# Altium footprint library MyPCB_Homework.PcbLib: 62 footprints (part 1 of 4)
Each footprint in its own frame and in the unit in brackets; x right, y up, seen from the top. Pads: shape width x height; smd on the part's side, far side on the other; paste and mask are expansions set on the pad; w line width, h text height; cw(c..) or ccw(c..) is an arc to the next point about the centre after c.
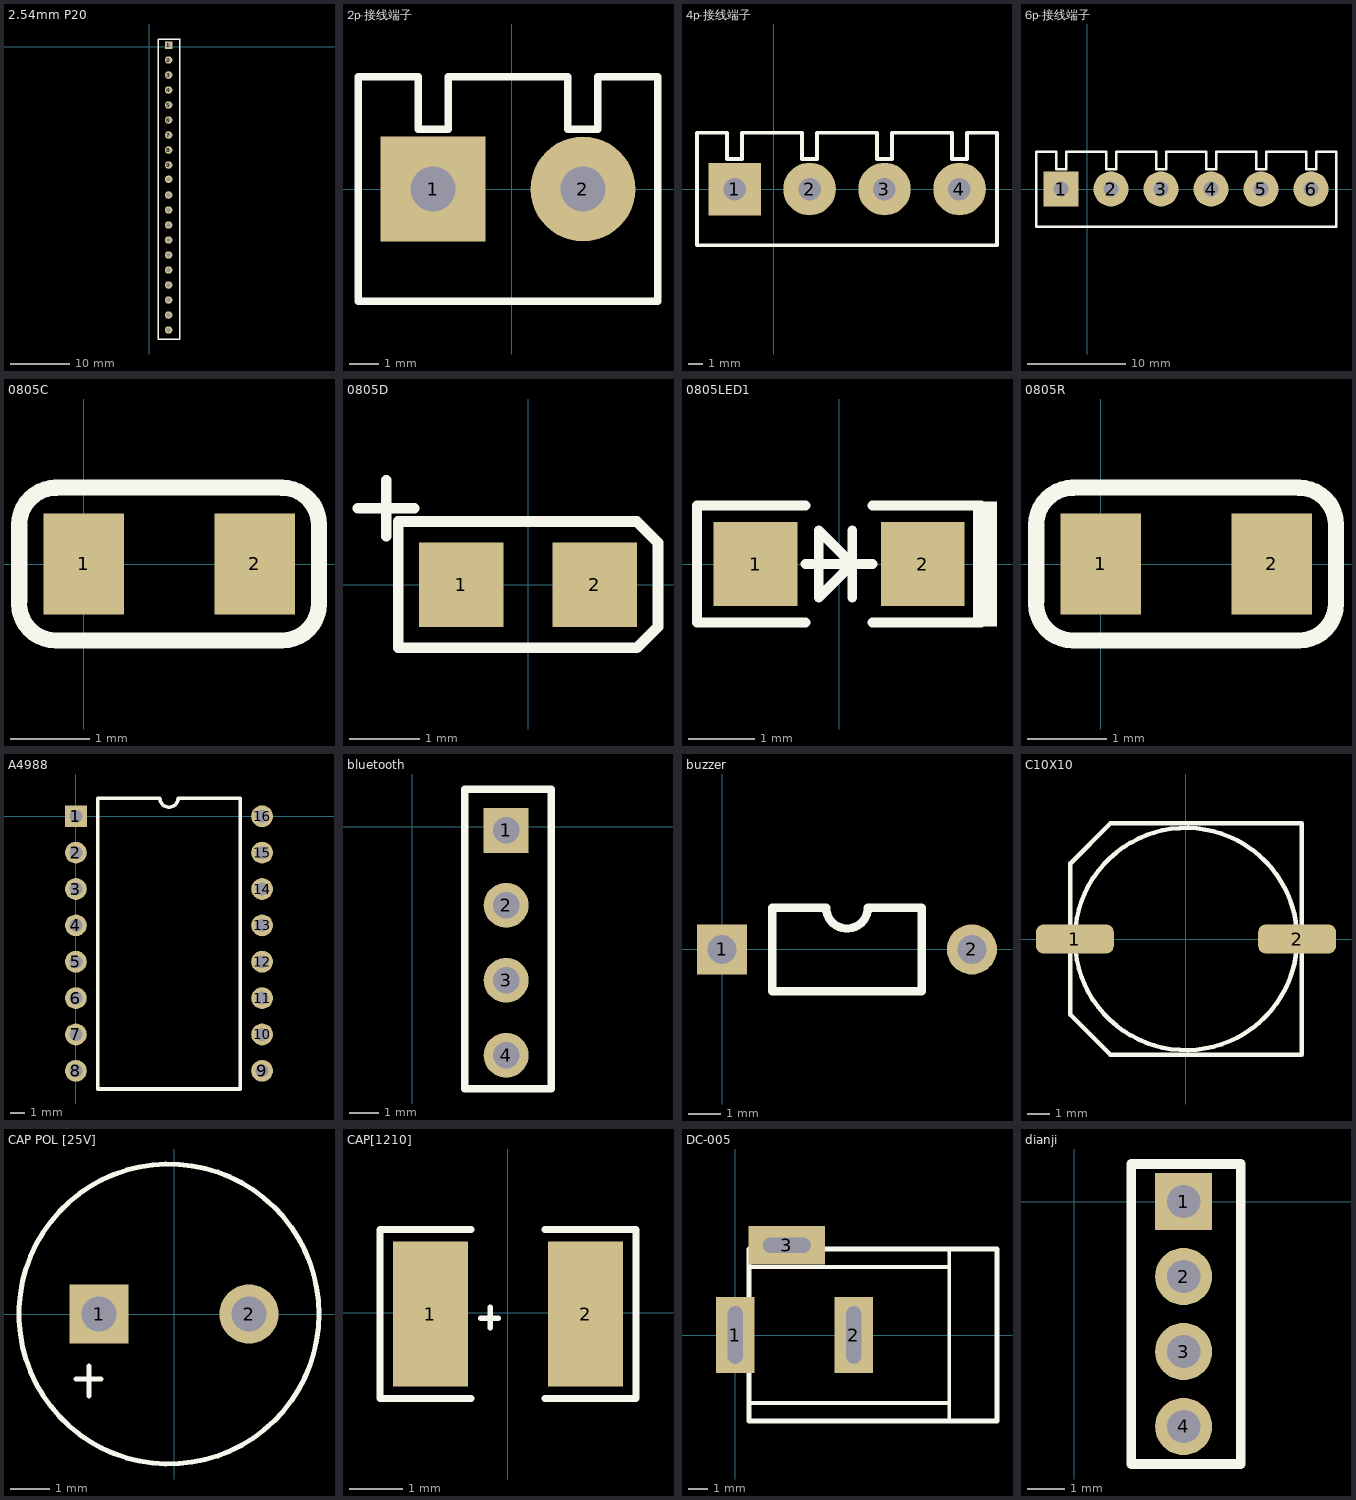
[diagram p0: the footprints below, top view; thin cyan lines are the x and y axes]

## 2.54mm P20 [mil]
pads (20):
  rect 50x50 hole 25: 1(130,10)
  round 50 hole 25: 2(130,-90) 3(130,-190) 4(130,-290) 5(130,-390) 6(130,-490) 7(130,-590) 8(130,-690) 9(130,-790) 10(130,-885) 11(130,-990) 12(130,-1090) 13(130,-1190) 14(130,-1290) 15(130,-1390) 16(130,-1490) 17(130,-1590) 18(130,-1690) 19(130,-1790) 20(130,-1890)
Top Overlay:
  lines w10: 60,-1950 60,50 205,50 205,-1950 60,-1950

## 2p-接线端子 [mil]
pads (2):
  rect 140x140 hole 60: 1(-105,0)
  round 140 hole 60: 2(95,0)
Top Overlay:
  lines w10: -205,-150 -205,150 -125,150 -125,80 -85,80 -85,150 75,150 75,80 115,80 115,150 195,150 195,-150 -205,-150
3D body "User Library-CN_BT_1X2.step": height 393.7, standoff -89.92, extent -201.69,-148.15 211.69,155

## 4p-接线端子 [mil]
pads (4):
  rect 140x140 hole 60: 1(-105,0)
  round 140 hole 60: 2(95,0) 3(295,0) 4(495,0)
Top Overlay:
  lines w10: -5,-150 395,-150 595,-150 ; -5,150 75,150 ; 590,150 595,150 ; 75,80 75,150 ; 75,80 115,80 ; 75,80 75,150 ; 75,80 115,80 ; 75,150 -85,150 -85,80 -125,80 -125,150 -205,150 -205,-150 195,-150 595,-150 ; 115,80 115,150 ; 115,80 115,150 ; 115,150 275,150 ; 115,150 195,150 275,150 ; 275,80 275,150 ; 275,80 315,80 ; 275,80 315,80 ; 275,80 275,150 ; 315,80 315,150 ; 315,80 315,150 ; 315,150 395,150 475,150 ; 315,150 475,150 ; 475,80 475,150 ; 475,80 515,80 ; 475,80 515,80 ; 475,80 475,150 ; 475,80 515,80 ; 475,80 475,150 ; 515,80 515,150 ; 515,80 515,150 ; 515,80 515,150 ; 515,150 595,150 ; 515,150 595,150 ; 595,-150 595,150
3D body "User Library-CN_BT_1X2.step": height 393.7, standoff -89.92, extent 198.31,-148.15 611.69,155
3D body "User Library-CN_BT_1X2.step": height 393.7, standoff -89.92, extent -201.69,-148.15 211.69,155

## 6p-接线端子 [mil]
pads (6):
  rect 140x140 hole 60: 1(-105,0)
  round 140 hole 60: 2(95,0) 3(295,0) 4(495,0) 5(695,0) 6(895,0)
Top Overlay:
  lines w10: -5,-150 395,-150 795,-150 ; -5,150 75,150 ; 75,80 75,150 ; 75,80 115,80 ; 75,80 75,150 ; 75,80 115,80 ; 75,150 -85,150 -85,80 -125,80 -125,150 -205,150 -205,-150 195,-150 595,-150 995,-150 995,150 915,150 915,80 875,80 875,150 715,150 ; 115,80 115,150 ; 115,80 115,150 ; 115,150 275,150 ; 115,150 195,150 275,150 ; 275,80 275,150 ; 275,80 315,80 ; 275,80 315,80 ; 275,80 275,150 ; 315,80 315,150 ; 315,80 315,150 ; 315,150 395,150 475,150 ; 315,150 475,150 ; 475,80 475,150 ; 475,80 515,80 ; 475,80 515,80 ; 475,80 475,150 ; 475,80 515,80 ; 475,80 475,150 ; 515,80 515,150 ; 515,80 515,150 ; 515,80 515,150 ; 515,150 675,150 ; 515,150 595,150 ; 515,150 595,150 ; 595,150 675,150 ; 675,80 675,150 ; 675,80 715,80 ; 675,80 715,80 ; 675,80 675,150 ; 675,80 675,150 ; 675,80 715,80 ; 715,80 715,150 ; 715,80 715,150 ; 715,80 715,150 ; 715,150 795,150 715,150
3D body "User Library-CN_BT_1X2.step": height 393.7, standoff -89.92, extent 398.31,-148.15 811.69,155
3D body "User Library-CN_BT_1X2.step": height 393.7, standoff -89.92, extent 598.31,-148.15 1011.69,155
3D body "User Library-CN_BT_1X2.step": height 393.7, standoff -89.92, extent 198.31,-148.15 611.69,155
3D body "User Library-CN_BT_1X2.step": height 393.7, standoff -89.92, extent -201.69,-148.15 211.69,155

## 0805C [mil]
pads (2):
  rect 40x50 smd: 1(0,0) 2(85,0)
Top Overlay:
  lines w8: -32.11,-19.59 ccw(c-13.7,-19.59) -13.7,-38 ; -32,-18.5 -32,18.5 ; -32,19.5 cw(c-13.59,19.5) -13.59,37.91 ; -14.12,38 98.09,38 ; -12.7,-38 98.11,-38 ; 98.59,-38 ccw(c98.59,-19.59) 117,-19.59 ; 98.59,37.91 cw(c98.59,19.5) 117,19.5 ; 117,-18.59 117,18.5
3D body "User Library-0805 SMD Capacitor.STEP": height 30.39, standoff -0.39, extent 3.15,-24.61 81.89,24.61

## 0805D [mm]
pads (2):
  rect 1.2x1.2 smd: 1(-0.95,0) 2(0.95,0)
Top Overlay:
  lines w0.15: -2.42,1.09 -1.62,1.09 ; -2.02,0.69 -2.02,1.49 ; -1.85,-0.9 -1.85,0.9 1.55,0.9 1.85,0.6 1.85,-0.6 1.55,-0.9 -1.85,-0.9

## 0805LED1 [mil]
pads (2):
  rect 50x50 smd: 1(-50,0) 2(50,0)
Top Overlay:
  rectangle: 80,-37.4 94.48,37.41
  lines w5.91: -20,-35 -85,-35 -85,35 -20,35 ; -20,0 20,0 ; 7.87,-20 7.87,20 ; 20,-35 85,-35 ; 20,35 85,35 ; -12.13,-20 -12.13,20 7.87,0 -12.13,-20
3D body "User Library-led_0805.STEP": height 43.31, standoff 0, extent -36.61,-24.21 42.91,25

## 0805R [mil]
pads (2):
  rect 40x50 smd: 1(0,0) 2(85,0)
Top Overlay:
  lines w8: -32.11,-19.59 ccw(c-13.7,-19.59) -13.7,-38 ; -32,-18.5 -32,18.5 ; -32,19.5 cw(c-13.59,19.5) -13.59,37.91 ; -14.12,38 98.09,38 ; -12.7,-38 98.11,-38 ; 98.59,-38 ccw(c98.59,-19.59) 117,-19.59 ; 98.59,37.91 cw(c98.59,19.5) 117,19.5 ; 117,-18.59 117,18.5
3D body "User Library-0805 SMD R.STEP": height 30.39, standoff -0.39, extent 3.26,-24.61 82,24.61

## A4988 [mil]
pads (16):
  rect 60x60 hole 35: 1(0,0)
  round 60 hole 35: 2(0,-100) 3(0,-200) 4(0,-300) 5(0,-400) 6(0,-500) 7(0,-600) 8(0,-700) 9(512,-700) 10(512,-600) 11(512,-500) 12(512,-400) 13(512,-300) 14(512,-200) 15(512,-100) 16(512,0)
Top Overlay:
  lines w10: 60,-750 60,50 231,50 ccw(c256,50) 281,50 452,50 452,-750 60,-750

## bluetooth [mil]
pads (4):
  rect 60x60 hole 35: 1(125,-5)
  round 60 hole 35: 2(125,-105) 3(125,-205) 4(125,-305)
Top Overlay:
  lines w10: 70,-350 185,-350 185,50 70,50 70,-350

## buzzer [mil]
pads (2):
  rect 60x60 hole 35: 1(0,0)
  round 60 hole 35: 2(299.2,0)
Top Overlay:
  lines w10: 60,-50 60,50 124.6,50 ccw(c149.6,50) 174.6,50 239.2,50 239.2,-50 60,-50

## C10X10 [mm]
pads (2):
  rrect50% 3.5x1.3 smd: 1(-5,0) 2(5,0)
Top Overlay:
  circle w0.2: c0,0 r5
  lines w0.2: -5.2,3.404 -5.2,-3.404 -3.404,-5.2 5.2,-5.2 5.2,5.2 -3.404,5.2 -5.191,3.413
3D body "SW3dPS-capacitor size G.STEP": height 10.21, standoff -0.01, extent -5.775,-5.118 5.825,5.182

## CAP POL [25V] [mm]
pads (2):
  rect 1.5x1.5 hole 0.9: 1(-1.905,0)
  round 1.5 hole 0.9: 2(1.905,0)
Top Overlay:
  circle w0.127: c-0.127,0 r3.81
  lines w0.127: -2.489,-1.651 -2.33,-1.651 -2.013,-1.651 -1.854,-1.651 ; -2.159,-2.083 -2.159,-1.321
3D body "8X12.STEP": height 12, standoff -2.5, extent -4,-4 4,4

## CAP[1210] [mm]
pads (2):
  rect 1.402x2.7 smd: 1(-1.45,-0.025) 2(1.45,-0.025)
Top Overlay:
  lines w0: -0.483,-0.102 -0.457,-0.076
  lines w0.102: -0.508,-0.102 -0.178,-0.102 ; -0.33,-0.279 -0.33,0.102
  lines w0.127: -0.686,-1.6 -2.388,-1.6 -2.388,1.549 -0.686,1.549 ; 0.686,-1.6 2.388,-1.6 2.388,1.549 0.686,1.549
Mechanical 13:
  lines w0: 1.7,-1.375 1.7,1.325

## DC-005 [mm] "5.5X2.1mm"
pads (3):
  rect 2x4 hole 0.8 slot 3 at 90 deg: 1(0,0) 2(6.2,0)
  rect 4x2 hole 0.8 slot 2.5 at 0 deg: 3(2.7,4.7)
Top Overlay:
  lines w0.2: 0.716,-3.556 11.2,-3.556 ; 0.716,3.556 11.2,3.556 ; 11.2,-4.5 11.2,4.5
  lines w0.254: 0.716,-4.5 13.7,-4.5 13.7,4.5 0.716,4.5 0.716,-4.5
3D body "DC-005.STEP": height 11.2, standoff -3.8, extent -0.404,-4.523 13.646,4.777

## dianji [mil]
pads (4):
  rect 60x60 hole 35: 1(115,0)
  round 60 hole 35: 2(115,-78.7) 3(115,-157.4) 4(115,-236.1)
Top Overlay:
  lines w10: 60,-275.45 175,-275.45 175,39.35 60,39.35 60,-275.45